# Altium footprint library con-samtec.PCBLIB: 805 footprints (part 40 of 55) (continued)
## TSW-129-02-S-Q [mm]
pads (58):
  oct 1.5x1.5 hole 1: 1(35.56,-2.54) 2(35.56,2.54) 3(33.02,-2.54) 4(33.02,2.54) 5(30.48,-2.54) 6(30.48,2.54) 7(27.94,-2.54) 8(27.94,2.54) 9(25.4,-2.54) 10(25.4,2.54) 11(22.86,-2.54) 12(22.86,2.54) 13(20.32,-2.54) 14(20.32,2.54) 15(17.78,-2.54) 16(17.78,2.54) 17(15.24,-2.54) 18(15.24,2.54) 19(12.7,-2.54) 20(12.7,2.54) 21(10.16,-2.54) 22(10.16,2.54) 23(7.62,-2.54) 24(7.62,2.54) 25(5.08,-2.54) 26(5.08,2.54) 27(2.54,-2.54) 28(2.54,2.54) 29(0,-2.54) 30(0,2.54) 31(-2.54,-2.54) 32(-2.54,2.54) 33(-5.08,-2.54) 34(-5.08,2.54) 35(-7.62,-2.54) 36(-7.62,2.54) 37(-10.16,-2.54) 38(-10.16,2.54) 39(-12.7,-2.54) 40(-12.7,2.54) 41(-15.24,-2.54) 42(-15.24,2.54) 43(-17.78,-2.54) 44(-17.78,2.54) 45(-20.32,-2.54) 46(-20.32,2.54) 47(-22.86,-2.54) 48(-22.86,2.54) 49(-25.4,-2.54) 50(-25.4,2.54) 51(-27.94,-2.54) 52(-27.94,2.54) 53(-30.48,-2.54) 54(-30.48,2.54) 55(-33.02,-2.54) 56(-33.02,2.54) 57(-35.56,-2.54) 58(-35.56,2.54)
Top Overlay:
  lines w0.203: -36.959,-3.695 36.959,-3.695 36.959,3.695 -36.959,3.695 -36.959,-3.695
  text "1" at 35.402,-5.138 h0.94
  text "2" at 35.302,3.989 h0.94
Mechanical 16:
  rectangle: -35.91,-2.89 -35.21,-2.19
  rectangle: -35.91,2.19 -35.21,2.89
  rectangle: -33.37,-2.89 -32.67,-2.19
  rectangle: -33.37,2.19 -32.67,2.89
  rectangle: -30.83,-2.89 -30.13,-2.19
  rectangle: -30.83,2.19 -30.13,2.89
  rectangle: -28.29,-2.89 -27.59,-2.19
  rectangle: -28.29,2.19 -27.59,2.89
  rectangle: -25.75,-2.89 -25.05,-2.19
  rectangle: -25.75,2.19 -25.05,2.89
  rectangle: -23.21,-2.89 -22.51,-2.19
  rectangle: -23.21,2.19 -22.51,2.89
  rectangle: -20.67,-2.89 -19.97,-2.19
  rectangle: -20.67,2.19 -19.97,2.89
  rectangle: -18.13,-2.89 -17.43,-2.19
  rectangle: -18.13,2.19 -17.43,2.89
  rectangle: -15.59,-2.89 -14.89,-2.19
  rectangle: -15.59,2.19 -14.89,2.89
  rectangle: -13.05,-2.89 -12.35,-2.19
  rectangle: -13.05,2.19 -12.35,2.89
  rectangle: -10.51,-2.89 -9.81,-2.19
  rectangle: -10.51,2.19 -9.81,2.89
  rectangle: -7.97,-2.89 -7.27,-2.19
  rectangle: -7.97,2.19 -7.27,2.89
  rectangle: -5.43,-2.89 -4.73,-2.19
  rectangle: -5.43,2.19 -4.73,2.89
  rectangle: -2.89,-2.89 -2.19,-2.19
  rectangle: -2.89,2.19 -2.19,2.89
  rectangle: -0.35,-2.89 0.35,-2.19
  rectangle: -0.35,2.19 0.35,2.89
  rectangle: 2.19,-2.89 2.89,-2.19
  rectangle: 2.19,2.19 2.89,2.89
  rectangle: 4.73,-2.89 5.43,-2.19
  rectangle: 4.73,2.19 5.43,2.89
  rectangle: 7.27,-2.89 7.97,-2.19
  rectangle: 7.27,2.19 7.97,2.89
  rectangle: 9.81,-2.89 10.51,-2.19
  rectangle: 9.81,2.19 10.51,2.89
  rectangle: 12.35,-2.89 13.05,-2.19
  rectangle: 12.35,2.19 13.05,2.89
  rectangle: 14.89,-2.89 15.59,-2.19
  rectangle: 14.89,2.19 15.59,2.89
  rectangle: 17.43,-2.89 18.13,-2.19
  rectangle: 17.43,2.19 18.13,2.89
  rectangle: 19.97,-2.89 20.67,-2.19
  rectangle: 19.97,2.19 20.67,2.89
  rectangle: 22.51,-2.89 23.21,-2.19
  rectangle: 22.51,2.19 23.21,2.89
  rectangle: 25.05,-2.89 25.75,-2.19
  rectangle: 25.05,2.19 25.75,2.89
  rectangle: 27.59,-2.89 28.29,-2.19
  rectangle: 27.59,2.19 28.29,2.89
  rectangle: 30.13,-2.89 30.83,-2.19
  rectangle: 30.13,2.19 30.83,2.89
  rectangle: 32.67,-2.89 33.37,-2.19
  rectangle: 32.67,2.19 33.37,2.89
  rectangle: 35.21,-2.89 35.91,-2.19
  rectangle: 35.21,2.19 35.91,2.89

## TSW-129-02-S-Q-RA [mil]
pads (58):
  oct 59.06x59.06 hole 39.37: 1(1400,60) 2(1400,260) 3(1300,60) 4(1300,260) 5(1200,60) 6(1200,260) 7(1100,60) 8(1100,260) 9(1000,60) 10(1000,260) 11(900,60) 12(900,260) 13(800,60) 14(800,260) 15(700,60) 16(700,260) 17(600,60) 18(600,260) 19(500,60) 20(500,260) 21(400,60) 22(400,260) 23(300,60) 24(300,260) 25(200,60) 26(200,260) 27(100,60) 28(100,260) 29(0,60) 30(0,260) 31(-100,60) 32(-100,260) 33(-200,60) 34(-200,260) 35(-300,60) 36(-300,260) 37(-400,60) 38(-400,260) 39(-500,60) 40(-500,260) 41(-600,60) 42(-600,260) 43(-700,60) 44(-700,260) 45(-800,60) 46(-800,260) 47(-900,60) 48(-900,260) 49(-1000,60) 50(-1000,260) 51(-1100,60) 52(-1100,260) 53(-1200,60) 54(-1200,260) 55(-1300,60) 56(-1300,260) 57(-1400,60) 58(-1400,260)
Top Overlay:
  rectangle: -1410,-310.63 -1390,-80.32
  rectangle: -1310,-310.63 -1290,-80.32
  rectangle: -1210,-310.63 -1190,-80.32
  rectangle: -1110,-310.63 -1090,-80.32
  rectangle: -1010,-310.63 -990,-80.32
  rectangle: -910,-310.63 -890,-80.32
  rectangle: -810,-310.63 -790,-80.32
  rectangle: -710,-310.63 -690,-80.32
  rectangle: -610,-310.63 -590,-80.32
  rectangle: -510,-310.63 -490,-80.32
  rectangle: -410,-310.63 -390,-80.32
  rectangle: -310,-310.63 -290,-80.32
  rectangle: -210,-310.63 -190,-80.32
  rectangle: -110,-310.63 -90,-80.32
  rectangle: -10,-310.63 10,-80.32
  rectangle: 90,-310.63 110,-80.32
  rectangle: 190,-310.63 210,-80.32
  rectangle: 290,-310.63 310,-80.32
  rectangle: 390,-310.63 410,-80.32
  rectangle: 490,-310.63 510,-80.32
  rectangle: 590,-310.63 610,-80.32
  rectangle: 690,-310.63 710,-80.32
  rectangle: 790,-310.63 810,-80.32
  rectangle: 890,-310.63 910,-80.32
  rectangle: 990,-310.63 1010,-80.32
  rectangle: 1090,-310.63 1110,-80.32
  rectangle: 1190,-310.63 1210,-80.32
  rectangle: 1290,-310.63 1310,-80.32
  rectangle: 1390,-310.63 1410,-80.32
  lines w8: -1455.08,-80.55 1455.08,-80.55 1455.08,-4.17 -1455.08,-4.17 -1455.08,-80.55
  text "1" at 1453.54,43.31 h36.81
  text "2" at 1451.18,242.72 h36.81
Mechanical 16:
  rectangle: -1410,0 -1390,270
  rectangle: -1310,0 -1290,270
  rectangle: -1210,0 -1190,270
  rectangle: -1110,0 -1090,270
  rectangle: -1010,0 -990,270
  rectangle: -910,0 -890,270
  rectangle: -810,0 -790,270
  rectangle: -710,0 -690,270
  rectangle: -610,0 -590,270
  rectangle: -510,0 -490,270
  rectangle: -410,0 -390,270
  rectangle: -310,0 -290,270
  rectangle: -210,0 -190,270
  rectangle: -110,0 -90,270
  rectangle: -10,0 10,270
  rectangle: 90,0 110,270
  rectangle: 190,0 210,270
  rectangle: 290,0 310,270
  rectangle: 390,0 410,270
  rectangle: 490,0 510,270
  rectangle: 590,0 610,270
  rectangle: 690,0 710,270
  rectangle: 790,0 810,270
  rectangle: 890,0 910,270
  rectangle: 990,0 1010,270
  rectangle: 1090,0 1110,270
  rectangle: 1190,0 1210,270
  rectangle: 1290,0 1310,270
  rectangle: 1390,0 1410,270

## TSW-129-02-S-S [mm]
pads (29):
  oct 1.5x1.5 hole 1: 1(35.56,0) 2(33.02,0) 3(30.48,0) 4(27.94,0) 5(25.4,0) 6(22.86,0) 7(20.32,0) 8(17.78,0) 9(15.24,0) 10(12.7,0) 11(10.16,0) 12(7.62,0) 13(5.08,0) 14(2.54,0) 15(0,0) 16(-2.54,0) 17(-5.08,0) 18(-7.62,0) 19(-10.16,0) 20(-12.7,0) 21(-15.24,0) 22(-17.78,0) 23(-20.32,0) 24(-22.86,0) 25(-25.4,0) 26(-27.94,0) 27(-30.48,0) 28(-33.02,0) 29(-35.56,0)
Top Overlay:
  lines w0.203: -36.959,-1.155 36.959,-1.155 36.959,1.155 -36.959,1.155 -36.959,-1.155
  text "1" at 35.302,-2.498 h0.94
Mechanical 16:
  rectangle: -35.91,-0.35 -35.21,0.35
  rectangle: -33.37,-0.35 -32.67,0.35
  rectangle: -30.83,-0.35 -30.13,0.35
  rectangle: -28.29,-0.35 -27.59,0.35
  rectangle: -25.75,-0.35 -25.05,0.35
  rectangle: -23.21,-0.35 -22.51,0.35
  rectangle: -20.67,-0.35 -19.97,0.35
  rectangle: -18.13,-0.35 -17.43,0.35
  rectangle: -15.59,-0.35 -14.89,0.35
  rectangle: -13.05,-0.35 -12.35,0.35
  rectangle: -10.51,-0.35 -9.81,0.35
  rectangle: -7.97,-0.35 -7.27,0.35
  rectangle: -5.43,-0.35 -4.73,0.35
  rectangle: -2.89,-0.35 -2.19,0.35
  rectangle: -0.35,-0.35 0.35,0.35
  rectangle: 2.19,-0.35 2.89,0.35
  rectangle: 4.73,-0.35 5.43,0.35
  rectangle: 7.27,-0.35 7.97,0.35
  rectangle: 9.81,-0.35 10.51,0.35
  rectangle: 12.35,-0.35 13.05,0.35
  rectangle: 14.89,-0.35 15.59,0.35
  rectangle: 17.43,-0.35 18.13,0.35
  rectangle: 19.97,-0.35 20.67,0.35
  rectangle: 22.51,-0.35 23.21,0.35
  rectangle: 25.05,-0.35 25.75,0.35
  rectangle: 27.59,-0.35 28.29,0.35
  rectangle: 30.13,-0.35 30.83,0.35
  rectangle: 32.67,-0.35 33.37,0.35
  rectangle: 35.21,-0.35 35.91,0.35

## TSW-129-02-S-S-RA [mil]
pads (29):
  oct 59.06x59.06 hole 39.37: 1(1400,60) 2(1300,60) 3(1200,60) 4(1100,60) 5(1000,60) 6(900,60) 7(800,60) 8(700,60) 9(600,60) 10(500,60) 11(400,60) 12(300,60) 13(200,60) 14(100,60) 15(0,60) 16(-100,60) 17(-200,60) 18(-300,60) 19(-400,60) 20(-500,60) 21(-600,60) 22(-700,60) 23(-800,60) 24(-900,60) 25(-1000,60) 26(-1100,60) 27(-1200,60) 28(-1300,60) 29(-1400,60)
Top Overlay:
  rectangle: -1410,-310.63 -1390,-80.32
  rectangle: -1310,-310.63 -1290,-80.32
  rectangle: -1210,-310.63 -1190,-80.32
  rectangle: -1110,-310.63 -1090,-80.32
  rectangle: -1010,-310.63 -990,-80.32
  rectangle: -910,-310.63 -890,-80.32
  rectangle: -810,-310.63 -790,-80.32
  rectangle: -710,-310.63 -690,-80.32
  rectangle: -610,-310.63 -590,-80.32
  rectangle: -510,-310.63 -490,-80.32
  rectangle: -410,-310.63 -390,-80.32
  rectangle: -310,-310.63 -290,-80.32
  rectangle: -210,-310.63 -190,-80.32
  rectangle: -110,-310.63 -90,-80.32
  rectangle: -10,-310.63 10,-80.32
  rectangle: 90,-310.63 110,-80.32
  rectangle: 190,-310.63 210,-80.32
  rectangle: 290,-310.63 310,-80.32
  rectangle: 390,-310.63 410,-80.32
  rectangle: 490,-310.63 510,-80.32
  rectangle: 590,-310.63 610,-80.32
  rectangle: 690,-310.63 710,-80.32
  rectangle: 790,-310.63 810,-80.32
  rectangle: 890,-310.63 910,-80.32
  rectangle: 990,-310.63 1010,-80.32
  rectangle: 1090,-310.63 1110,-80.32
  rectangle: 1190,-310.63 1210,-80.32
  rectangle: 1290,-310.63 1310,-80.32
  rectangle: 1390,-310.63 1410,-80.32
  lines w8: -1455.08,-80.55 1455.08,-80.55 1455.08,-4.17 -1455.08,-4.17 -1455.08,-80.55
  text "1" at 1450.47,45.35 h36.81
Mechanical 16:
  rectangle: -1410,0 -1390,70
  rectangle: -1310,0 -1290,70
  rectangle: -1210,0 -1190,70
  rectangle: -1110,0 -1090,70
  rectangle: -1010,0 -990,70
  rectangle: -910,0 -890,70
  rectangle: -810,0 -790,70
  rectangle: -710,0 -690,70
  rectangle: -610,0 -590,70
  rectangle: -510,0 -490,70
  rectangle: -410,0 -390,70
  rectangle: -310,0 -290,70
  rectangle: -210,0 -190,70
  rectangle: -110,0 -90,70
  rectangle: -10,0 10,70
  rectangle: 90,0 110,70
  rectangle: 190,0 210,70
  rectangle: 290,0 310,70
  rectangle: 390,0 410,70
  rectangle: 490,0 510,70
  rectangle: 590,0 610,70
  rectangle: 690,0 710,70
  rectangle: 790,0 810,70
  rectangle: 890,0 910,70
  rectangle: 990,0 1010,70
  rectangle: 1090,0 1110,70
  rectangle: 1190,0 1210,70
  rectangle: 1290,0 1310,70
  rectangle: 1390,0 1410,70

## TSW-129-02-S-T [mm]
pads (87):
  oct 1.5x1.5 hole 1: 1(35.56,-2.54) 2(35.56,0) 3(35.56,2.54) 4(33.02,-2.54) 5(33.02,0) 6(33.02,2.54) 7(30.48,-2.54) 8(30.48,0) 9(30.48,2.54) 10(27.94,-2.54) 11(27.94,0) 12(27.94,2.54) 13(25.4,-2.54) 14(25.4,0) 15(25.4,2.54) 16(22.86,-2.54) 17(22.86,0) 18(22.86,2.54) 19(20.32,-2.54) 20(20.32,0) 21(20.32,2.54) 22(17.78,-2.54) 23(17.78,0) 24(17.78,2.54) 25(15.24,-2.54) 26(15.24,0) 27(15.24,2.54) 28(12.7,-2.54) 29(12.7,0) 30(12.7,2.54) 31(10.16,-2.54) 32(10.16,0) 33(10.16,2.54) 34(7.62,-2.54) 35(7.62,0) 36(7.62,2.54) 37(5.08,-2.54) 38(5.08,0) 39(5.08,2.54) 40(2.54,-2.54) 41(2.54,0) 42(2.54,2.54) 43(0,-2.54) 44(0,0) 45(0,2.54) 46(-2.54,-2.54) 47(-2.54,0) 48(-2.54,2.54) 49(-5.08,-2.54) 50(-5.08,0) 51(-5.08,2.54) 52(-7.62,-2.54) 53(-7.62,0) 54(-7.62,2.54) 55(-10.16,-2.54) 56(-10.16,0) 57(-10.16,2.54) 58(-12.7,-2.54) 59(-12.7,0) 60(-12.7,2.54) 61(-15.24,-2.54) 62(-15.24,0) 63(-15.24,2.54) 64(-17.78,-2.54) 65(-17.78,0) 66(-17.78,2.54) 67(-20.32,-2.54) 68(-20.32,0) 69(-20.32,2.54) 70(-22.86,-2.54) 71(-22.86,0) 72(-22.86,2.54) 73(-25.4,-2.54) 74(-25.4,0) 75(-25.4,2.54) 76(-27.94,-2.54) 77(-27.94,0) 78(-27.94,2.54) 79(-30.48,-2.54) 80(-30.48,0) 81(-30.48,2.54) 82(-33.02,-2.54) 83(-33.02,0) 84(-33.02,2.54) 85(-35.56,-2.54) 86(-35.56,0) 87(-35.56,2.54)
Top Overlay:
  lines w0.203: -36.959,-3.695 36.959,-3.695 36.959,3.695 -36.959,3.695 -36.959,-3.695
  text "1" at 35.252,-5.188 h0.94
  text "3" at 35.248,3.989 h0.94
Mechanical 16:
  rectangle: -35.91,-2.89 -35.21,-2.19
  rectangle: -35.91,-0.35 -35.21,0.35
  rectangle: -35.91,2.19 -35.21,2.89
  rectangle: -33.37,-2.89 -32.67,-2.19
  rectangle: -33.37,-0.35 -32.67,0.35
  rectangle: -33.37,2.19 -32.67,2.89
  rectangle: -30.83,-2.89 -30.13,-2.19
  rectangle: -30.83,-0.35 -30.13,0.35
  rectangle: -30.83,2.19 -30.13,2.89
  rectangle: -28.29,-2.89 -27.59,-2.19
  rectangle: -28.29,-0.35 -27.59,0.35
  rectangle: -28.29,2.19 -27.59,2.89
  rectangle: -25.75,-2.89 -25.05,-2.19
  rectangle: -25.75,-0.35 -25.05,0.35
  rectangle: -25.75,2.19 -25.05,2.89
  rectangle: -23.21,-2.89 -22.51,-2.19
  rectangle: -23.21,-0.35 -22.51,0.35
  rectangle: -23.21,2.19 -22.51,2.89
  rectangle: -20.67,-2.89 -19.97,-2.19
  rectangle: -20.67,-0.35 -19.97,0.35
  rectangle: -20.67,2.19 -19.97,2.89
  rectangle: -18.13,-2.89 -17.43,-2.19
  rectangle: -18.13,-0.35 -17.43,0.35
  rectangle: -18.13,2.19 -17.43,2.89
  rectangle: -15.59,-2.89 -14.89,-2.19
  rectangle: -15.59,-0.35 -14.89,0.35
  rectangle: -15.59,2.19 -14.89,2.89
  rectangle: -13.05,-2.89 -12.35,-2.19
  rectangle: -13.05,-0.35 -12.35,0.35
  rectangle: -13.05,2.19 -12.35,2.89
  rectangle: -10.51,-2.89 -9.81,-2.19
  rectangle: -10.51,-0.35 -9.81,0.35
  rectangle: -10.51,2.19 -9.81,2.89
  rectangle: -7.97,-2.89 -7.27,-2.19
  rectangle: -7.97,-0.35 -7.27,0.35
  rectangle: -7.97,2.19 -7.27,2.89
  rectangle: -5.43,-2.89 -4.73,-2.19
  rectangle: -5.43,-0.35 -4.73,0.35
  rectangle: -5.43,2.19 -4.73,2.89
  rectangle: -2.89,-2.89 -2.19,-2.19
  rectangle: -2.89,-0.35 -2.19,0.35
  rectangle: -2.89,2.19 -2.19,2.89
  rectangle: -0.35,-2.89 0.35,-2.19
  rectangle: -0.35,-0.35 0.35,0.35
  rectangle: -0.35,2.19 0.35,2.89
  rectangle: 2.19,-2.89 2.89,-2.19
  rectangle: 2.19,-0.35 2.89,0.35
  rectangle: 2.19,2.19 2.89,2.89
  rectangle: 4.73,-2.89 5.43,-2.19
  rectangle: 4.73,-0.35 5.43,0.35
  rectangle: 4.73,2.19 5.43,2.89
  rectangle: 7.27,-2.89 7.97,-2.19
  rectangle: 7.27,-0.35 7.97,0.35
  rectangle: 7.27,2.19 7.97,2.89
  rectangle: 9.81,-2.89 10.51,-2.19
  rectangle: 9.81,-0.35 10.51,0.35
  rectangle: 9.81,2.19 10.51,2.89
  rectangle: 12.35,-2.89 13.05,-2.19
  rectangle: 12.35,-0.35 13.05,0.35
  rectangle: 12.35,2.19 13.05,2.89
  rectangle: 14.89,-2.89 15.59,-2.19
  rectangle: 14.89,-0.35 15.59,0.35
  rectangle: 14.89,2.19 15.59,2.89
  rectangle: 17.43,-2.89 18.13,-2.19
  rectangle: 17.43,-0.35 18.13,0.35
  rectangle: 17.43,2.19 18.13,2.89
  rectangle: 19.97,-2.89 20.67,-2.19
  rectangle: 19.97,-0.35 20.67,0.35
  rectangle: 19.97,2.19 20.67,2.89
  rectangle: 22.51,-2.89 23.21,-2.19
  rectangle: 22.51,-0.35 23.21,0.35
  rectangle: 22.51,2.19 23.21,2.89
  rectangle: 25.05,-2.89 25.75,-2.19
  rectangle: 25.05,-0.35 25.75,0.35
  rectangle: 25.05,2.19 25.75,2.89
  rectangle: 27.59,-2.89 28.29,-2.19
  rectangle: 27.59,-0.35 28.29,0.35
  rectangle: 27.59,2.19 28.29,2.89
  rectangle: 30.13,-2.89 30.83,-2.19
  rectangle: 30.13,-0.35 30.83,0.35
  rectangle: 30.13,2.19 30.83,2.89
  rectangle: 32.67,-2.89 33.37,-2.19
  rectangle: 32.67,-0.35 33.37,0.35
  rectangle: 32.67,2.19 33.37,2.89
  rectangle: 35.21,-2.89 35.91,-2.19
  rectangle: 35.21,-0.35 35.91,0.35
  rectangle: 35.21,2.19 35.91,2.89

## TSW-129-02-S-T-RA [mil]
pads (87):
  oct 59.06x59.06 hole 39.37: 1(1400,60) 2(1400,160) 3(1400,260) 4(1300,60) 5(1300,160) 6(1300,260) 7(1200,60) 8(1200,160) 9(1200,260) 10(1100,60) 11(1100,160) 12(1100,260) 13(1000,60) 14(1000,160) 15(1000,260) 16(900,60) 17(900,160) 18(900,260) 19(800,60) 20(800,160) 21(800,260) 22(700,60) 23(700,160) 24(700,260) 25(600,60) 26(600,160) 27(600,260) 28(500,60) 29(500,160) 30(500,260) 31(400,60) 32(400,160) 33(400,260) 34(300,60) 35(300,160) 36(300,260) 37(200,60) 38(200,160) 39(200,260) 40(100,60) 41(100,160) 42(100,260) 43(0,60) 44(0,160) 45(0,260) 46(-100,60) 47(-100,160) 48(-100,260) 49(-200,60) 50(-200,160) 51(-200,260) 52(-300,60) 53(-300,160) 54(-300,260) 55(-400,60) 56(-400,160) 57(-400,260) 58(-500,60) 59(-500,160) 60(-500,260) 61(-600,60) 62(-600,160) 63(-600,260) 64(-700,60) 65(-700,160) 66(-700,260) 67(-800,60) 68(-800,160) 69(-800,260) 70(-900,60) 71(-900,160) 72(-900,260) 73(-1000,60) 74(-1000,160) 75(-1000,260) 76(-1100,60) 77(-1100,160) 78(-1100,260) 79(-1200,60) 80(-1200,160) 81(-1200,260) 82(-1300,60) 83(-1300,160) 84(-1300,260) 85(-1400,60) 86(-1400,160) 87(-1400,260)
Top Overlay:
  rectangle: -1410,-310.63 -1390,-80.32
  rectangle: -1310,-310.63 -1290,-80.32
  rectangle: -1210,-310.63 -1190,-80.32
  rectangle: -1110,-310.63 -1090,-80.32
  rectangle: -1010,-310.63 -990,-80.32
  rectangle: -910,-310.63 -890,-80.32
  rectangle: -810,-310.63 -790,-80.32
  rectangle: -710,-310.63 -690,-80.32
  rectangle: -610,-310.63 -590,-80.32
  rectangle: -510,-310.63 -490,-80.32
  rectangle: -410,-310.63 -390,-80.32
  rectangle: -310,-310.63 -290,-80.32
  rectangle: -210,-310.63 -190,-80.32
  rectangle: -110,-310.63 -90,-80.32
  rectangle: -10,-310.63 10,-80.32
  rectangle: 90,-310.63 110,-80.32
  rectangle: 190,-310.63 210,-80.32
  rectangle: 290,-310.63 310,-80.32
  rectangle: 390,-310.63 410,-80.32
  rectangle: 490,-310.63 510,-80.32
  rectangle: 590,-310.63 610,-80.32
  rectangle: 690,-310.63 710,-80.32
  rectangle: 790,-310.63 810,-80.32
  rectangle: 890,-310.63 910,-80.32
  rectangle: 990,-310.63 1010,-80.32
  rectangle: 1090,-310.63 1110,-80.32
  rectangle: 1190,-310.63 1210,-80.32
  rectangle: 1290,-310.63 1310,-80.32
  rectangle: 1390,-310.63 1410,-80.32
  lines w8: -1455.08,-80.55 1455.08,-80.55 1455.08,-4.17 -1455.08,-4.17 -1455.08,-80.55
  text "1" at 1451.57,41.34 h36.81
  text "3" at 1452.17,236.81 h36.81
Mechanical 16:
  rectangle: -1410,0 -1390,270
  rectangle: -1310,0 -1290,270
  rectangle: -1210,0 -1190,270
  rectangle: -1110,0 -1090,270
  rectangle: -1010,0 -990,270
  rectangle: -910,0 -890,270
  rectangle: -810,0 -790,270
  rectangle: -710,0 -690,270
  rectangle: -610,0 -590,270
  rectangle: -510,0 -490,270
  rectangle: -410,0 -390,270
  rectangle: -310,0 -290,270
  rectangle: -210,0 -190,270
  rectangle: -110,0 -90,270
  rectangle: -10,0 10,270
  rectangle: 90,0 110,270
  rectangle: 190,0 210,270
  rectangle: 290,0 310,270
  rectangle: 390,0 410,270
  rectangle: 490,0 510,270
  rectangle: 590,0 610,270
  rectangle: 690,0 710,270
  rectangle: 790,0 810,270
  rectangle: 890,0 910,270
  rectangle: 990,0 1010,270
  rectangle: 1090,0 1110,270
  rectangle: 1190,0 1210,270
  rectangle: 1290,0 1310,270
  rectangle: 1390,0 1410,270

## TSW-130-02-S-D [mm]
pads (60):
  oct 1.5x1.5 hole 1: 1(36.83,-1.27) 2(36.83,1.27) 3(34.29,-1.27) 4(34.29,1.27) 5(31.75,-1.27) 6(31.75,1.27) 7(29.21,-1.27) 8(29.21,1.27) 9(26.67,-1.27) 10(26.67,1.27) 11(24.13,-1.27) 12(24.13,1.27) 13(21.59,-1.27) 14(21.59,1.27) 15(19.05,-1.27) 16(19.05,1.27) 17(16.51,-1.27) 18(16.51,1.27) 19(13.97,-1.27) 20(13.97,1.27) 21(11.43,-1.27) 22(11.43,1.27) 23(8.89,-1.27) 24(8.89,1.27) 25(6.35,-1.27) 26(6.35,1.27) 27(3.81,-1.27) 28(3.81,1.27) 29(1.27,-1.27) 30(1.27,1.27) 31(-1.27,-1.27) 32(-1.27,1.27) 33(-3.81,-1.27) 34(-3.81,1.27) 35(-6.35,-1.27) 36(-6.35,1.27) 37(-8.89,-1.27) 38(-8.89,1.27) 39(-11.43,-1.27) 40(-11.43,1.27) 41(-13.97,-1.27) 42(-13.97,1.27) 43(-16.51,-1.27) 44(-16.51,1.27) 45(-19.05,-1.27) 46(-19.05,1.27) 47(-21.59,-1.27) 48(-21.59,1.27) 49(-24.13,-1.27) 50(-24.13,1.27) 51(-26.67,-1.27) 52(-26.67,1.27) 53(-29.21,-1.27) 54(-29.21,1.27) 55(-31.75,-1.27) 56(-31.75,1.27) 57(-34.29,-1.27) 58(-34.29,1.27) 59(-36.83,-1.27) 60(-36.83,1.27)
Top Overlay:
  lines w0.203: -38.229,-2.425 38.229,-2.425 38.229,2.425 -38.229,2.425 -38.229,-2.425
  text "1" at 36.622,-3.818 h0.94
  text "2" at 36.447,2.744 h0.94
Mechanical 16:
  rectangle: -37.18,-1.62 -36.48,-0.92
  rectangle: -37.18,0.92 -36.48,1.62
  rectangle: -34.64,-1.62 -33.94,-0.92
  rectangle: -34.64,0.92 -33.94,1.62
  rectangle: -32.1,-1.62 -31.4,-0.92
  rectangle: -32.1,0.92 -31.4,1.62
  rectangle: -29.56,-1.62 -28.86,-0.92
  rectangle: -29.56,0.92 -28.86,1.62
  rectangle: -27.02,-1.62 -26.32,-0.92
  rectangle: -27.02,0.92 -26.32,1.62
  rectangle: -24.48,-1.62 -23.78,-0.92
  rectangle: -24.48,0.92 -23.78,1.62
  rectangle: -21.94,-1.62 -21.24,-0.92
  rectangle: -21.94,0.92 -21.24,1.62
  rectangle: -19.4,-1.62 -18.7,-0.92
  rectangle: -19.4,0.92 -18.7,1.62
  rectangle: -16.86,-1.62 -16.16,-0.92
  rectangle: -16.86,0.92 -16.16,1.62
  rectangle: -14.32,-1.62 -13.62,-0.92
  rectangle: -14.32,0.92 -13.62,1.62
  rectangle: -11.78,-1.62 -11.08,-0.92
  rectangle: -11.78,0.92 -11.08,1.62
  rectangle: -9.24,-1.62 -8.54,-0.92
  rectangle: -9.24,0.92 -8.54,1.62
  rectangle: -6.7,-1.62 -6,-0.92
  rectangle: -6.7,0.92 -6,1.62
  rectangle: -4.16,-1.62 -3.46,-0.92
  rectangle: -4.16,0.92 -3.46,1.62
  rectangle: -1.62,-1.62 -0.92,-0.92
  rectangle: -1.62,0.92 -0.92,1.62
  rectangle: 0.92,-1.62 1.62,-0.92
  rectangle: 0.92,0.92 1.62,1.62
  rectangle: 3.46,-1.62 4.16,-0.92
  rectangle: 3.46,0.92 4.16,1.62
  rectangle: 6,-1.62 6.7,-0.92
  rectangle: 6,0.92 6.7,1.62
  rectangle: 8.54,-1.62 9.24,-0.92
  rectangle: 8.54,0.92 9.24,1.62
  rectangle: 11.08,-1.62 11.78,-0.92
  rectangle: 11.08,0.92 11.78,1.62
  rectangle: 13.62,-1.62 14.32,-0.92
  rectangle: 13.62,0.92 14.32,1.62
  rectangle: 16.16,-1.62 16.86,-0.92
  rectangle: 16.16,0.92 16.86,1.62
  rectangle: 18.7,-1.62 19.4,-0.92
  rectangle: 18.7,0.92 19.4,1.62
  rectangle: 21.24,-1.62 21.94,-0.92
  rectangle: 21.24,0.92 21.94,1.62
  rectangle: 23.78,-1.62 24.48,-0.92
  rectangle: 23.78,0.92 24.48,1.62
  rectangle: 26.32,-1.62 27.02,-0.92
  rectangle: 26.32,0.92 27.02,1.62
  rectangle: 28.86,-1.62 29.56,-0.92
  rectangle: 28.86,0.92 29.56,1.62
  rectangle: 31.4,-1.62 32.1,-0.92
  rectangle: 31.4,0.92 32.1,1.62
  rectangle: 33.94,-1.62 34.64,-0.92
  rectangle: 33.94,0.92 34.64,1.62
  rectangle: 36.48,-1.62 37.18,-0.92
  rectangle: 36.48,0.92 37.18,1.62

## TSW-130-02-S-D-RA [mil]
pads (60):
  oct 59.06x59.06 hole 39.37: 1(1450,60) 2(1450,160) 3(1350,60) 4(1350,160) 5(1250,60) 6(1250,160) 7(1150,60) 8(1150,160) 9(1050,60) 10(1050,160) 11(950,60) 12(950,160) 13(850,60) 14(850,160) 15(750,60) 16(750,160) 17(650,60) 18(650,160) 19(550,60) 20(550,160) 21(450,60) 22(450,160) 23(350,60) 24(350,160) 25(250,60) 26(250,160) 27(150,60) 28(150,160) 29(50,60) 30(50,160) 31(-50,60) 32(-50,160) 33(-150,60) 34(-150,160) 35(-250,60) 36(-250,160) 37(-350,60) 38(-350,160) 39(-450,60) 40(-450,160) 41(-550,60) 42(-550,160) 43(-650,60) 44(-650,160) 45(-750,60) 46(-750,160) 47(-850,60) 48(-850,160) 49(-950,60) 50(-950,160) 51(-1050,60) 52(-1050,160) 53(-1150,60) 54(-1150,160) 55(-1250,60) 56(-1250,160) 57(-1350,60) 58(-1350,160) 59(-1450,60) 60(-1450,160)
Top Overlay:
  rectangle: -1460,-310.63 -1440,-80.32
  rectangle: -1360,-310.63 -1340,-80.32
  rectangle: -1260,-310.63 -1240,-80.32
  rectangle: -1160,-310.63 -1140,-80.32
  rectangle: -1060,-310.63 -1040,-80.32
  rectangle: -960,-310.63 -940,-80.32
  rectangle: -860,-310.63 -840,-80.32
  rectangle: -760,-310.63 -740,-80.32
  rectangle: -660,-310.63 -640,-80.32
  rectangle: -560,-310.63 -540,-80.32
  rectangle: -460,-310.63 -440,-80.32
  rectangle: -360,-310.63 -340,-80.32
  rectangle: -260,-310.63 -240,-80.32
  rectangle: -160,-310.63 -140,-80.32
  rectangle: -60,-310.63 -40,-80.32
  rectangle: 40,-310.63 60,-80.32
  rectangle: 140,-310.63 160,-80.32
  rectangle: 240,-310.63 260,-80.32
  rectangle: 340,-310.63 360,-80.32
  rectangle: 440,-310.63 460,-80.32
  rectangle: 540,-310.63 560,-80.32
  rectangle: 640,-310.63 660,-80.32
  rectangle: 740,-310.63 760,-80.32
  rectangle: 840,-310.63 860,-80.32
  rectangle: 940,-310.63 960,-80.32
  rectangle: 1040,-310.63 1060,-80.32
  rectangle: 1140,-310.63 1160,-80.32
  rectangle: 1240,-310.63 1260,-80.32
  rectangle: 1340,-310.63 1360,-80.32
  rectangle: 1440,-310.63 1460,-80.32
  lines w8: -1505.08,-80.55 1505.08,-80.55 1505.08,-4.17 -1505.08,-4.17 -1505.08,-80.55
  text "1" at 1500.59,30.51 h36.81
  text "2" at 1499.21,129.53 h36.81
Mechanical 16:
  rectangle: -1460,0 -1440,170
  rectangle: -1360,0 -1340,170
  rectangle: -1260,0 -1240,170
  rectangle: -1160,0 -1140,170
  rectangle: -1060,0 -1040,170
  rectangle: -960,0 -940,170
  rectangle: -860,0 -840,170
  rectangle: -760,0 -740,170
  rectangle: -660,0 -640,170
  rectangle: -560,0 -540,170
  rectangle: -460,0 -440,170
  rectangle: -360,0 -340,170
  rectangle: -260,0 -240,170
  rectangle: -160,0 -140,170
  rectangle: -60,0 -40,170
  rectangle: 40,0 60,170
  rectangle: 140,0 160,170
  rectangle: 240,0 260,170
  rectangle: 340,0 360,170
  rectangle: 440,0 460,170
  rectangle: 540,0 560,170
  rectangle: 640,0 660,170
  rectangle: 740,0 760,170
  rectangle: 840,0 860,170
  rectangle: 940,0 960,170
  rectangle: 1040,0 1060,170
  rectangle: 1140,0 1160,170
  rectangle: 1240,0 1260,170
  rectangle: 1340,0 1360,170
  rectangle: 1440,0 1460,170

## TSW-130-02-S-Q [mm]
pads (60):
  oct 1.5x1.5 hole 1: 1(36.83,-2.54) 2(36.83,2.54) 3(34.29,-2.54) 4(34.29,2.54) 5(31.75,-2.54) 6(31.75,2.54) 7(29.21,-2.54) 8(29.21,2.54) 9(26.67,-2.54) 10(26.67,2.54) 11(24.13,-2.54) 12(24.13,2.54) 13(21.59,-2.54) 14(21.59,2.54) 15(19.05,-2.54) 16(19.05,2.54) 17(16.51,-2.54) 18(16.51,2.54) 19(13.97,-2.54) 20(13.97,2.54) 21(11.43,-2.54) 22(11.43,2.54) 23(8.89,-2.54) 24(8.89,2.54) 25(6.35,-2.54) 26(6.35,2.54) 27(3.81,-2.54) 28(3.81,2.54) 29(1.27,-2.54) 30(1.27,2.54) 31(-1.27,-2.54) 32(-1.27,2.54) 33(-3.81,-2.54) 34(-3.81,2.54) 35(-6.35,-2.54) 36(-6.35,2.54) 37(-8.89,-2.54) 38(-8.89,2.54) 39(-11.43,-2.54) 40(-11.43,2.54) 41(-13.97,-2.54) 42(-13.97,2.54) 43(-16.51,-2.54) 44(-16.51,2.54) 45(-19.05,-2.54) 46(-19.05,2.54) 47(-21.59,-2.54) 48(-21.59,2.54) 49(-24.13,-2.54) 50(-24.13,2.54) 51(-26.67,-2.54) 52(-26.67,2.54) 53(-29.21,-2.54) 54(-29.21,2.54) 55(-31.75,-2.54) 56(-31.75,2.54) 57(-34.29,-2.54) 58(-34.29,2.54) 59(-36.83,-2.54) 60(-36.83,2.54)
Top Overlay:
  lines w0.203: -38.229,-3.695 38.229,-3.695 38.229,3.695 -38.229,3.695 -38.229,-3.695
  text "1" at 36.672,-5.138 h0.94
  text "2" at 36.572,3.989 h0.94
Mechanical 16:
  rectangle: -37.18,-2.89 -36.48,-2.19
  rectangle: -37.18,2.19 -36.48,2.89
  rectangle: -34.64,-2.89 -33.94,-2.19
  rectangle: -34.64,2.19 -33.94,2.89
  rectangle: -32.1,-2.89 -31.4,-2.19
  rectangle: -32.1,2.19 -31.4,2.89
  rectangle: -29.56,-2.89 -28.86,-2.19
  rectangle: -29.56,2.19 -28.86,2.89
  rectangle: -27.02,-2.89 -26.32,-2.19
  rectangle: -27.02,2.19 -26.32,2.89
  rectangle: -24.48,-2.89 -23.78,-2.19
  rectangle: -24.48,2.19 -23.78,2.89
  rectangle: -21.94,-2.89 -21.24,-2.19
  rectangle: -21.94,2.19 -21.24,2.89
  rectangle: -19.4,-2.89 -18.7,-2.19
  rectangle: -19.4,2.19 -18.7,2.89
  rectangle: -16.86,-2.89 -16.16,-2.19
  rectangle: -16.86,2.19 -16.16,2.89
  rectangle: -14.32,-2.89 -13.62,-2.19
  rectangle: -14.32,2.19 -13.62,2.89
  rectangle: -11.78,-2.89 -11.08,-2.19
  rectangle: -11.78,2.19 -11.08,2.89
  rectangle: -9.24,-2.89 -8.54,-2.19
  rectangle: -9.24,2.19 -8.54,2.89
  rectangle: -6.7,-2.89 -6,-2.19
  rectangle: -6.7,2.19 -6,2.89
  rectangle: -4.16,-2.89 -3.46,-2.19
  rectangle: -4.16,2.19 -3.46,2.89
  rectangle: -1.62,-2.89 -0.92,-2.19
  rectangle: -1.62,2.19 -0.92,2.89
  rectangle: 0.92,-2.89 1.62,-2.19
  rectangle: 0.92,2.19 1.62,2.89
  rectangle: 3.46,-2.89 4.16,-2.19
  rectangle: 3.46,2.19 4.16,2.89
  rectangle: 6,-2.89 6.7,-2.19
  rectangle: 6,2.19 6.7,2.89
  rectangle: 8.54,-2.89 9.24,-2.19
  rectangle: 8.54,2.19 9.24,2.89
  rectangle: 11.08,-2.89 11.78,-2.19
  rectangle: 11.08,2.19 11.78,2.89
  rectangle: 13.62,-2.89 14.32,-2.19
  rectangle: 13.62,2.19 14.32,2.89
  rectangle: 16.16,-2.89 16.86,-2.19
  rectangle: 16.16,2.19 16.86,2.89
  rectangle: 18.7,-2.89 19.4,-2.19
  rectangle: 18.7,2.19 19.4,2.89
  rectangle: 21.24,-2.89 21.94,-2.19
  rectangle: 21.24,2.19 21.94,2.89
  rectangle: 23.78,-2.89 24.48,-2.19
  rectangle: 23.78,2.19 24.48,2.89
  rectangle: 26.32,-2.89 27.02,-2.19
  rectangle: 26.32,2.19 27.02,2.89
  rectangle: 28.86,-2.89 29.56,-2.19
  rectangle: 28.86,2.19 29.56,2.89
  rectangle: 31.4,-2.89 32.1,-2.19
  rectangle: 31.4,2.19 32.1,2.89
  rectangle: 33.94,-2.89 34.64,-2.19
  rectangle: 33.94,2.19 34.64,2.89
  rectangle: 36.48,-2.89 37.18,-2.19
  rectangle: 36.48,2.19 37.18,2.89